# Altium schematic symbol library jlcpcb_2025_04_capacitors_extended_0201.schlib: 1175 symbols (part 1 of 7) (continued)
## 0201CG0R2C500NT
designator C?  Capacitance: 0.2pF  (hidden comment: *)
Capacitor, Ceramic (MLCC), 0.2pF, 50V, C0G, SMD 0201; Manufacturer: FH (Guangdong Fenghua Advanced Tech); Manufacturer Part Number: 0201CG0R2C500NT; Package Size: 0201; JLCPCB Basic Part: No; JLCPCB Part Number: C2857960; Supplier 1: LCSC; Category: Capacitors - MLCC; Supplier Part Number 1: C2857960; Voltage Rating: 50V; Temperature Coefficient: C0G; RoHS: Yes; ComponentLink1Description: Datasheet; ComponentLink2Description: JLCPCB Part URL; ComponentLink2URL: https://jlcpcb.com/partdetail/C2857960; ComponentLink3Description: LCSC Part URL; ComponentLink3URL: https://lcsc.com/product-detail/Multilayer-Ceramic-Capacitors-MLCC---SMD-SMT_FH-Guangdong-Fenghua-Advanced-Tech-FH-Guangdong-Fenghua-Advanced-Tech-0201CG0R2C500NT_C2857960.html
footprint CAP-0201 (0201 (0603M) Capacitor)
pins: 1, 2

## 0201CG0R7C500NT
designator C?  Capacitance: 0.7pF  (hidden comment: *)
Capacitor, Ceramic (MLCC), 0.7pF, 50V, SMD 0201; Manufacturer: FH(Guangdong Fenghua Advanced Tech); Manufacturer Part Number: 0201CG0R7C500NT; Package Size: 0201; JLCPCB Basic Part: No; JLCPCB Part Number: C1322344; Supplier 1: LCSC; Category: Capacitors - MLCC; Supplier Part Number 1: C1322344; Voltage Rating: 50V; RoHS: Yes; ComponentLink1Description: Datasheet; ComponentLink1URL: https://wmsc.lcsc.com/wmsc/upload/file/pdf/v2/lcsc/2304140030_FH--Guangdong-Fenghua-Advanced-Tech-0201CG0R7C500NT_C1322344.pdf; ComponentLink2Description: JLCPCB Part URL; ComponentLink2URL: https://jlcpcb.com/partdetail/C1322344; ComponentLink3Description: LCSC Part URL; ComponentLink3URL: https://lcsc.com/product-detail/Multilayer-Ceramic-Capacitors-MLCC---SMD-SMT_FH-Guangdong-Fenghua-Advanced-Tech-FH-Guangdong-Fenghua-Advanced-Tech-0201CG0R7C500NT_C1322344.html
footprint CAP-0201 (0201 (0603M) Capacitor)
pins: 1, 2

## 0201CG0R8B500NT
designator C?  Capacitance: 0.8pF  (hidden comment: *)
Capacitor, Ceramic (MLCC), 0.8pF, 50V, C0G, SMD 0201; Manufacturer: FH (Guangdong Fenghua Advanced Tech); Manufacturer Part Number: 0201CG0R8B500NT; Package Size: 0201; JLCPCB Basic Part: No; JLCPCB Part Number: C285040; Supplier 1: LCSC; Category: Capacitors - MLCC; Supplier Part Number 1: C285040; Voltage Rating: 50V; Temperature Coefficient: C0G; RoHS: Yes; ComponentLink1Description: Datasheet; ComponentLink2Description: JLCPCB Part URL; ComponentLink2URL: https://jlcpcb.com/partdetail/C285040; ComponentLink3Description: LCSC Part URL; ComponentLink3URL: https://lcsc.com/product-detail/Multilayer-Ceramic-Capacitors-MLCC---SMD-SMT_FH-Guangdong-Fenghua-Advanced-Tech-FH-Guangdong-Fenghua-Advanced-Tech-0201CG0R8B500NT_C285040.html
footprint CAP-0201 (0201 (0603M) Capacitor)
pins: 1, 2

## 0201CG0R8C500NT
designator C?  Capacitance: 0.8pF  (hidden comment: *)
Capacitor, Ceramic (MLCC), 0.8pF, 50V, SMD 0201; Manufacturer: FH(Guangdong Fenghua Advanced Tech); Manufacturer Part Number: 0201CG0R8C500NT; Package Size: 0201; JLCPCB Basic Part: No; JLCPCB Part Number: C1322345; Supplier 1: LCSC; Category: Capacitors - MLCC; Supplier Part Number 1: C1322345; Voltage Rating: 50V; RoHS: Yes; ComponentLink1Description: Datasheet; ComponentLink1URL: https://wmsc.lcsc.com/wmsc/upload/file/pdf/v2/lcsc/2304140030_FH--Guangdong-Fenghua-Advanced-Tech-0201CG0R8C500NT_C1322345.pdf; ComponentLink2Description: JLCPCB Part URL; ComponentLink2URL: https://jlcpcb.com/partdetail/C1322345; ComponentLink3Description: LCSC Part URL; ComponentLink3URL: https://lcsc.com/product-detail/Multilayer-Ceramic-Capacitors-MLCC---SMD-SMT_FH-Guangdong-Fenghua-Advanced-Tech-FH-Guangdong-Fenghua-Advanced-Tech-0201CG0R8C500NT_C1322345.html
footprint CAP-0201 (0201 (0603M) Capacitor)
pins: 1, 2

## 0201CG0R9C500NT
designator C?  Capacitance: 0.9pF  (hidden comment: *)
Capacitor, Ceramic (MLCC), 0.9pF, 50V, C0G, SMD 0201; Manufacturer: FH (Guangdong Fenghua Advanced Tech); Manufacturer Part Number: 0201CG0R9C500NT; Package Size: 0201; JLCPCB Basic Part: No; JLCPCB Part Number: C50387; Supplier 1: LCSC; Category: Capacitors - MLCC; Supplier Part Number 1: C50387; Voltage Rating: 50V; Temperature Coefficient: C0G; RoHS: Yes; ComponentLink1Description: Datasheet; ComponentLink1URL: https://wmsc.lcsc.com/wmsc/upload/file/pdf/v2/lcsc/2304140030_FH--Guangdong-Fenghua-Advanced-Tech-0201CG0R9C500NT_C50387.pdf; ComponentLink2Description: JLCPCB Part URL; ComponentLink2URL: https://jlcpcb.com/partdetail/C50387; ComponentLink3Description: LCSC Part URL; ComponentLink3URL: https://lcsc.com/product-detail/Multilayer-Ceramic-Capacitors-MLCC---SMD-SMT_FH-Guangdong-Fenghua-Advanced-Tech-FH-Guangdong-Fenghua-Advanced-Tech-0201CG0R9C500NT_C50387.html
footprint CAP-0201 (0201 (0603M) Capacitor)
pins: 1, 2

## 0201CG1R0C250NT
designator C?  Capacitance: 1pF  (hidden comment: *)
Capacitor, Ceramic (MLCC), 1pF, 25V, C0G, SMD 0201; Manufacturer: FH(Guangdong Fenghua Advanced Tech); Manufacturer Part Number: 0201CG1R0C250NT; Package Size: 0201; JLCPCB Basic Part: No; JLCPCB Part Number: C301901; Supplier 1: LCSC; Category: Capacitors - MLCC; Supplier Part Number 1: C301901; Voltage Rating: 25V; Temperature Coefficient: C0G; RoHS: Yes; ComponentLink1Description: Datasheet; ComponentLink1URL: https://wmsc.lcsc.com/wmsc/upload/file/pdf/v2/lcsc/2304140030_FH--Guangdong-Fenghua-Advanced-Tech-0201CG1R0C250NT_C301901.pdf; ComponentLink2Description: JLCPCB Part URL; ComponentLink2URL: https://jlcpcb.com/partdetail/C301901; ComponentLink3Description: LCSC Part URL; ComponentLink3URL: https://lcsc.com/product-detail/Multilayer-Ceramic-Capacitors-MLCC---SMD-SMT_FH-Guangdong-Fenghua-Advanced-Tech-FH-Guangdong-Fenghua-Advanced-Tech-0201CG1R0C250NT_C301901.html
footprint CAP-0201 (0201 (0603M) Capacitor)
pins: 1, 2

## 0201CG1R1B250NT
designator C?  Capacitance: 1.1pF  (hidden comment: *)
Capacitor, Ceramic (MLCC), 1.1pF, 25V, C0G, SMD 0201; Manufacturer: FH (Guangdong Fenghua Advanced Tech); Manufacturer Part Number: 0201CG1R1B250NT; Package Size: 0201; JLCPCB Basic Part: No; JLCPCB Part Number: C2857962; Supplier 1: LCSC; Category: Capacitors - MLCC; Supplier Part Number 1: C2857962; Voltage Rating: 25V; Temperature Coefficient: C0G; RoHS: Yes; ComponentLink1Description: Datasheet; ComponentLink2Description: JLCPCB Part URL; ComponentLink2URL: https://jlcpcb.com/partdetail/C2857962; ComponentLink3Description: LCSC Part URL; ComponentLink3URL: https://lcsc.com/product-detail/Multilayer-Ceramic-Capacitors-MLCC---SMD-SMT_FH-Guangdong-Fenghua-Advanced-Tech-FH-Guangdong-Fenghua-Advanced-Tech-0201CG1R1B250NT_C2857962.html
footprint CAP-0201 (0201 (0603M) Capacitor)
pins: 1, 2

## 0201CG1R2B500NT
designator C?  Capacitance: 1.2pF  (hidden comment: *)
Capacitor, Ceramic (MLCC), 1.2pF, 50V, C0G, SMD 0201; Manufacturer: FH(Guangdong Fenghua Advanced Tech); Manufacturer Part Number: 0201CG1R2B500NT; Package Size: 0201; JLCPCB Basic Part: No; JLCPCB Part Number: C285029; Supplier 1: LCSC; Category: Capacitors - MLCC; Supplier Part Number 1: C285029; Voltage Rating: 50V; Temperature Coefficient: C0G; RoHS: Yes; ComponentLink1Description: Datasheet; ComponentLink1URL: https://wmsc.lcsc.com/wmsc/upload/file/pdf/v2/lcsc/2304140030_FH--Guangdong-Fenghua-Advanced-Tech-0201CG1R2B500NT_C285029.pdf; ComponentLink2Description: JLCPCB Part URL; ComponentLink2URL: https://jlcpcb.com/partdetail/C285029; ComponentLink3Description: LCSC Part URL; ComponentLink3URL: https://lcsc.com/product-detail/Multilayer-Ceramic-Capacitors-MLCC---SMD-SMT_FH-Guangdong-Fenghua-Advanced-Tech-FH-Guangdong-Fenghua-Advanced-Tech-0201CG1R2B500NT_C285029.html
footprint CAP-0201 (0201 (0603M) Capacitor)
pins: 1, 2

## 0201CG1R3B250NT
designator C?  Capacitance: 1.3pF  (hidden comment: *)
Capacitor, Ceramic (MLCC), 1.3pF, 25V, C0G, SMD 0201; Manufacturer: FH (Guangdong Fenghua Advanced Tech); Manufacturer Part Number: 0201CG1R3B250NT; Package Size: 0201; JLCPCB Basic Part: No; JLCPCB Part Number: C2857963; Supplier 1: LCSC; Category: Capacitors - MLCC; Supplier Part Number 1: C2857963; Voltage Rating: 25V; Temperature Coefficient: C0G; RoHS: Yes; ComponentLink1Description: Datasheet; ComponentLink2Description: JLCPCB Part URL; ComponentLink2URL: https://jlcpcb.com/partdetail/C2857963; ComponentLink3Description: LCSC Part URL; ComponentLink3URL: https://lcsc.com/product-detail/Multilayer-Ceramic-Capacitors-MLCC---SMD-SMT_FH-Guangdong-Fenghua-Advanced-Tech-FH-Guangdong-Fenghua-Advanced-Tech-0201CG1R3B250NT_C2857963.html
footprint CAP-0201 (0201 (0603M) Capacitor)
pins: 1, 2

## 0201CG1R3C500NT
designator C?  Capacitance: 1.3pF  (hidden comment: *)
Capacitor, Ceramic (MLCC), 1.3pF, 50V, C0G, SMD 0201; Manufacturer: FH(Guangdong Fenghua Advanced Tech); Manufacturer Part Number: 0201CG1R3C500NT; Package Size: 0201; JLCPCB Basic Part: No; JLCPCB Part Number: C913423; Supplier 1: LCSC; Category: Capacitors - MLCC; Supplier Part Number 1: C913423; Voltage Rating: 50V; Temperature Coefficient: C0G; RoHS: Yes; ComponentLink1Description: Datasheet; ComponentLink1URL: https://wmsc.lcsc.com/wmsc/upload/file/pdf/v2/lcsc/2304140030_FH--Guangdong-Fenghua-Advanced-Tech-0201CG1R3C500NT_C913423.pdf; ComponentLink2Description: JLCPCB Part URL; ComponentLink2URL: https://jlcpcb.com/partdetail/C913423; ComponentLink3Description: LCSC Part URL; ComponentLink3URL: https://lcsc.com/product-detail/Multilayer-Ceramic-Capacitors-MLCC---SMD-SMT_FH-Guangdong-Fenghua-Advanced-Tech-FH-Guangdong-Fenghua-Advanced-Tech-0201CG1R3C500NT_C913423.html
footprint CAP-0201 (0201 (0603M) Capacitor)
pins: 1, 2

## 0201CG1R5B500NT
designator C?  Capacitance: 1.5pF  (hidden comment: *)
Capacitor, Ceramic (MLCC), 1.5pF, 50V, C0G, SMD 0201; Manufacturer: FH (Guangdong Fenghua Advanced Tech); Manufacturer Part Number: 0201CG1R5B500NT; Package Size: 0201; JLCPCB Basic Part: No; JLCPCB Part Number: C284990; Supplier 1: LCSC; Category: Capacitors - MLCC; Supplier Part Number 1: C284990; Voltage Rating: 50V; Temperature Coefficient: C0G; RoHS: Yes; ComponentLink1Description: Datasheet; ComponentLink1URL: https://wmsc.lcsc.com/wmsc/upload/file/pdf/v2/lcsc/2304140030_FH--Guangdong-Fenghua-Advanced-Tech-0201CG1R5B500NT_C284990.pdf; ComponentLink2Description: JLCPCB Part URL; ComponentLink2URL: https://jlcpcb.com/partdetail/C284990; ComponentLink3Description: LCSC Part URL; ComponentLink3URL: https://lcsc.com/product-detail/Multilayer-Ceramic-Capacitors-MLCC---SMD-SMT_FH-Guangdong-Fenghua-Advanced-Tech-FH-Guangdong-Fenghua-Advanced-Tech-0201CG1R5B500NT_C284990.html
footprint CAP-0201 (0201 (0603M) Capacitor)
pins: 1, 2

## 0201CG1R5C250NT
designator C?  Capacitance: 1.5pF  (hidden comment: *)
Capacitor, Ceramic (MLCC), 1.5pF, 25V, C0G, SMD 0201; Manufacturer: FH (Guangdong Fenghua Advanced Tech); Manufacturer Part Number: 0201CG1R5C250NT; Package Size: 0201; JLCPCB Basic Part: No; JLCPCB Part Number: C301903; Supplier 1: LCSC; Category: Capacitors - MLCC; Supplier Part Number 1: C301903; Voltage Rating: 25V; Temperature Coefficient: C0G; RoHS: Yes; ComponentLink1Description: Datasheet; ComponentLink1URL: https://wmsc.lcsc.com/wmsc/upload/file/pdf/v2/lcsc/2304140030_FH--Guangdong-Fenghua-Advanced-Tech-0201CG1R5C250NT_C301903.pdf; ComponentLink2Description: JLCPCB Part URL; ComponentLink2URL: https://jlcpcb.com/partdetail/C301903; ComponentLink3Description: LCSC Part URL; ComponentLink3URL: https://lcsc.com/product-detail/Multilayer-Ceramic-Capacitors-MLCC---SMD-SMT_FH-Guangdong-Fenghua-Advanced-Tech-FH-Guangdong-Fenghua-Advanced-Tech-0201CG1R5C250NT_C301903.html
footprint CAP-0201 (0201 (0603M) Capacitor)
pins: 1, 2

## 0201CG1R5C500NT
designator C?  Capacitance: 1.5pF  (hidden comment: *)
Capacitor, Ceramic (MLCC), 1.5pF, 50V, C0G, SMD 0201; Manufacturer: FH (Guangdong Fenghua Advanced Tech); Manufacturer Part Number: 0201CG1R5C500NT; Package Size: 0201; JLCPCB Basic Part: No; JLCPCB Part Number: C50389; Supplier 1: LCSC; Category: Capacitors - MLCC; Supplier Part Number 1: C50389; Voltage Rating: 50V; Temperature Coefficient: C0G; RoHS: Yes; ComponentLink1Description: Datasheet; ComponentLink1URL: https://wmsc.lcsc.com/wmsc/upload/file/pdf/v2/lcsc/2304140030_FH--Guangdong-Fenghua-Advanced-Tech-0201CG1R5C500NT_C50389.pdf; ComponentLink2Description: JLCPCB Part URL; ComponentLink2URL: https://jlcpcb.com/partdetail/C50389; ComponentLink3Description: LCSC Part URL; ComponentLink3URL: https://lcsc.com/product-detail/Multilayer-Ceramic-Capacitors-MLCC---SMD-SMT_FH-Guangdong-Fenghua-Advanced-Tech-FH-Guangdong-Fenghua-Advanced-Tech-0201CG1R5C500NT_C50389.html
footprint CAP-0201 (0201 (0603M) Capacitor)
pins: 1, 2

## 0201CG1R8C250NT
designator C?  Capacitance: 1.8pF  (hidden comment: *)
Capacitor, Ceramic (MLCC), 1.8pF, 25V, C0G, SMD 0201; Manufacturer: FH (Guangdong Fenghua Advanced Tech); Manufacturer Part Number: 0201CG1R8C250NT; Package Size: 0201; JLCPCB Basic Part: No; JLCPCB Part Number: C285155; Supplier 1: LCSC; Category: Capacitors - MLCC; Supplier Part Number 1: C285155; Voltage Rating: 25V; Temperature Coefficient: C0G; RoHS: Yes; ComponentLink1Description: Datasheet; ComponentLink2Description: JLCPCB Part URL; ComponentLink2URL: https://jlcpcb.com/partdetail/C285155; ComponentLink3Description: LCSC Part URL; ComponentLink3URL: https://lcsc.com/product-detail/Multilayer-Ceramic-Capacitors-MLCC---SMD-SMT_FH-Guangdong-Fenghua-Advanced-Tech-FH-Guangdong-Fenghua-Advanced-Tech-0201CG1R8C250NT_C285155.html
footprint CAP-0201 (0201 (0603M) Capacitor)
pins: 1, 2

## 0201CG2R2B250NT
designator C?  Capacitance: 2.2pF  (hidden comment: *)
Capacitor, Ceramic (MLCC), 2.2pF, 25V, C0G, SMD 0201; Manufacturer: FH (Guangdong Fenghua Advanced Tech); Manufacturer Part Number: 0201CG2R2B250NT; Package Size: 0201; JLCPCB Basic Part: No; JLCPCB Part Number: C285141; Supplier 1: LCSC; Category: Capacitors - MLCC; Supplier Part Number 1: C285141; Voltage Rating: 25V; Temperature Coefficient: C0G; RoHS: Yes; ComponentLink1Description: Datasheet; ComponentLink2Description: JLCPCB Part URL; ComponentLink2URL: https://jlcpcb.com/partdetail/C285141; ComponentLink3Description: LCSC Part URL; ComponentLink3URL: https://lcsc.com/product-detail/Multilayer-Ceramic-Capacitors-MLCC---SMD-SMT_FH-Guangdong-Fenghua-Advanced-Tech-FH-Guangdong-Fenghua-Advanced-Tech-0201CG2R2B250NT_C285141.html
footprint CAP-0201 (0201 (0603M) Capacitor)
pins: 1, 2

## 0201CG2R4B500NT
designator C?  Capacitance: 2.4pF  (hidden comment: *)
Capacitor, Ceramic (MLCC), 2.4pF, 50V, C0G, SMD 0201; Manufacturer: FH (Guangdong Fenghua Advanced Tech); Manufacturer Part Number: 0201CG2R4B500NT; Package Size: 0201; JLCPCB Basic Part: No; JLCPCB Part Number: C2857964; Supplier 1: LCSC; Category: Capacitors - MLCC; Supplier Part Number 1: C2857964; Voltage Rating: 50V; Temperature Coefficient: C0G; RoHS: Yes; ComponentLink1Description: Datasheet; ComponentLink2Description: JLCPCB Part URL; ComponentLink2URL: https://jlcpcb.com/partdetail/C2857964; ComponentLink3Description: LCSC Part URL; ComponentLink3URL: https://lcsc.com/product-detail/Multilayer-Ceramic-Capacitors-MLCC---SMD-SMT_FH-Guangdong-Fenghua-Advanced-Tech-FH-Guangdong-Fenghua-Advanced-Tech-0201CG2R4B500NT_C2857964.html
footprint CAP-0201 (0201 (0603M) Capacitor)
pins: 1, 2

## 0201CG2R7B500NT
designator C?  Capacitance: 2.7pF  (hidden comment: *)
Capacitor, Ceramic (MLCC), 2.7pF, 50V, C0G, SMD 0201; Manufacturer: FH (Guangdong Fenghua Advanced Tech); Manufacturer Part Number: 0201CG2R7B500NT; Package Size: 0201; JLCPCB Basic Part: No; JLCPCB Part Number: C285196; Supplier 1: LCSC; Category: Capacitors - MLCC; Supplier Part Number 1: C285196; Voltage Rating: 50V; Temperature Coefficient: C0G; RoHS: Yes; ComponentLink1Description: Datasheet; ComponentLink2Description: JLCPCB Part URL; ComponentLink2URL: https://jlcpcb.com/partdetail/C285196; ComponentLink3Description: LCSC Part URL; ComponentLink3URL: https://lcsc.com/product-detail/Multilayer-Ceramic-Capacitors-MLCC---SMD-SMT_FH-Guangdong-Fenghua-Advanced-Tech-FH-Guangdong-Fenghua-Advanced-Tech-0201CG2R7B500NT_C285196.html
footprint CAP-0201 (0201 (0603M) Capacitor)
pins: 1, 2

## 0201CG2R7C500NT
designator C?  Capacitance: 2.7pF  (hidden comment: *)
Capacitor, Ceramic (MLCC), 2.7pF, 50V, C0G, SMD 0201; Manufacturer: FH(Guangdong Fenghua Advanced Tech); Manufacturer Part Number: 0201CG2R7C500NT; Package Size: 0201; JLCPCB Basic Part: No; JLCPCB Part Number: C509406; Supplier 1: LCSC; Category: Capacitors - MLCC; Supplier Part Number 1: C509406; Voltage Rating: 50V; Temperature Coefficient: C0G; RoHS: Yes; ComponentLink1Description: Datasheet; ComponentLink1URL: https://wmsc.lcsc.com/wmsc/upload/file/pdf/v2/lcsc/2304140030_FH--Guangdong-Fenghua-Advanced-Tech-0201CG2R7C500NT_C509406.pdf; ComponentLink2Description: JLCPCB Part URL; ComponentLink2URL: https://jlcpcb.com/partdetail/C509406; ComponentLink3Description: LCSC Part URL; ComponentLink3URL: https://lcsc.com/product-detail/Multilayer-Ceramic-Capacitors-MLCC---SMD-SMT_FH-Guangdong-Fenghua-Advanced-Tech-FH-Guangdong-Fenghua-Advanced-Tech-0201CG2R7C500NT_C509406.html
footprint CAP-0201 (0201 (0603M) Capacitor)
pins: 1, 2

## 0201CG3R0C250NT
designator C?  Capacitance: 3pF  (hidden comment: *)
Capacitor, Ceramic (MLCC), 3pF, 25V, C0G, SMD 0201; Manufacturer: FH (Guangdong Fenghua Advanced Tech); Manufacturer Part Number: 0201CG3R0C250NT; Package Size: 0201; JLCPCB Basic Part: No; JLCPCB Part Number: C301908; Supplier 1: LCSC; Category: Capacitors - MLCC; Supplier Part Number 1: C301908; Voltage Rating: 25V; Temperature Coefficient: C0G; RoHS: Yes; ComponentLink1Description: Datasheet; ComponentLink1URL: https://wmsc.lcsc.com/wmsc/upload/file/pdf/v2/lcsc/2304140030_FH--Guangdong-Fenghua-Advanced-Tech-0201CG3R0C250NT_C301908.pdf; ComponentLink2Description: JLCPCB Part URL; ComponentLink2URL: https://jlcpcb.com/partdetail/C301908; ComponentLink3Description: LCSC Part URL; ComponentLink3URL: https://lcsc.com/product-detail/Multilayer-Ceramic-Capacitors-MLCC---SMD-SMT_FH-Guangdong-Fenghua-Advanced-Tech-FH-Guangdong-Fenghua-Advanced-Tech-0201CG3R0C250NT_C301908.html
footprint CAP-0201 (0201 (0603M) Capacitor)
pins: 1, 2

## 0201CG3R3B500NT
designator C?  Capacitance: 3.3pF  (hidden comment: *)
Capacitor, Ceramic (MLCC), 3.3pF, 50V, C0G, SMD 0201; Manufacturer: FH (Guangdong Fenghua Advanced Tech); Manufacturer Part Number: 0201CG3R3B500NT; Package Size: 0201; JLCPCB Basic Part: No; JLCPCB Part Number: C285027; Supplier 1: LCSC; Category: Capacitors - MLCC; Supplier Part Number 1: C285027; Voltage Rating: 50V; Temperature Coefficient: C0G; RoHS: Yes; ComponentLink1Description: Datasheet; ComponentLink1URL: https://wmsc.lcsc.com/wmsc/upload/file/pdf/v2/lcsc/2304140030_FH--Guangdong-Fenghua-Advanced-Tech-0201CG3R3B500NT_C285027.pdf; ComponentLink2Description: JLCPCB Part URL; ComponentLink2URL: https://jlcpcb.com/partdetail/C285027; ComponentLink3Description: LCSC Part URL; ComponentLink3URL: https://lcsc.com/product-detail/Multilayer-Ceramic-Capacitors-MLCC---SMD-SMT_FH-Guangdong-Fenghua-Advanced-Tech-FH-Guangdong-Fenghua-Advanced-Tech-0201CG3R3B500NT_C285027.html
footprint CAP-0201 (0201 (0603M) Capacitor)
pins: 1, 2

## 0201CG3R6C500NT
designator C?  Capacitance: 3.6pF  (hidden comment: *)
Capacitor, Ceramic (MLCC), 3.6pF, 50V, C0G, SMD 0201; Manufacturer: FH (Guangdong Fenghua Advanced Tech); Manufacturer Part Number: 0201CG3R6C500NT; Package Size: 0201; JLCPCB Basic Part: No; JLCPCB Part Number: C301911; Supplier 1: LCSC; Category: Capacitors - MLCC; Supplier Part Number 1: C301911; Voltage Rating: 50V; Temperature Coefficient: C0G; RoHS: Yes; ComponentLink1Description: Datasheet; ComponentLink1URL: https://wmsc.lcsc.com/wmsc/upload/file/pdf/v2/lcsc/2304140030_FH--Guangdong-Fenghua-Advanced-Tech-0201CG3R6C500NT_C301911.pdf; ComponentLink2Description: JLCPCB Part URL; ComponentLink2URL: https://jlcpcb.com/partdetail/C301911; ComponentLink3Description: LCSC Part URL; ComponentLink3URL: https://lcsc.com/product-detail/Multilayer-Ceramic-Capacitors-MLCC---SMD-SMT_FH-Guangdong-Fenghua-Advanced-Tech-FH-Guangdong-Fenghua-Advanced-Tech-0201CG3R6C500NT_C301911.html
footprint CAP-0201 (0201 (0603M) Capacitor)
pins: 1, 2

## 0201CG3R9C250NT
designator C?  Capacitance: 3.9pF  (hidden comment: *)
Capacitor, Ceramic (MLCC), 3.9pF, 25V, C0G, SMD 0201; Manufacturer: FH (Guangdong Fenghua Advanced Tech); Manufacturer Part Number: 0201CG3R9C250NT; Package Size: 0201; JLCPCB Basic Part: No; JLCPCB Part Number: C285100; Supplier 1: LCSC; Category: Capacitors - MLCC; Supplier Part Number 1: C285100; Voltage Rating: 25V; Temperature Coefficient: C0G; RoHS: Yes; ComponentLink1Description: Datasheet; ComponentLink2Description: JLCPCB Part URL; ComponentLink2URL: https://jlcpcb.com/partdetail/C285100; ComponentLink3Description: LCSC Part URL; ComponentLink3URL: https://lcsc.com/product-detail/Multilayer-Ceramic-Capacitors-MLCC---SMD-SMT_FH-Guangdong-Fenghua-Advanced-Tech-FH-Guangdong-Fenghua-Advanced-Tech-0201CG3R9C250NT_C285100.html
footprint CAP-0201 (0201 (0603M) Capacitor)
pins: 1, 2

## 0201CG4R3C500NT
designator C?  Capacitance: 4.3pF  (hidden comment: *)
Capacitor, Ceramic (MLCC), 4.3pF, 50V, C0G, SMD 0201; Manufacturer: FH (Guangdong Fenghua Advanced Tech); Manufacturer Part Number: 0201CG4R3C500NT; Package Size: 0201; JLCPCB Basic Part: No; JLCPCB Part Number: C285053; Supplier 1: LCSC; Category: Capacitors - MLCC; Supplier Part Number 1: C285053; Voltage Rating: 50V; Temperature Coefficient: C0G; RoHS: Yes; ComponentLink1Description: Datasheet; ComponentLink1URL: https://wmsc.lcsc.com/wmsc/upload/file/pdf/v2/lcsc/2304140030_FH--Guangdong-Fenghua-Advanced-Tech-0201CG4R3C500NT_C285053.pdf; ComponentLink2Description: JLCPCB Part URL; ComponentLink2URL: https://jlcpcb.com/partdetail/C285053; ComponentLink3Description: LCSC Part URL; ComponentLink3URL: https://lcsc.com/product-detail/Multilayer-Ceramic-Capacitors-MLCC---SMD-SMT_FH-Guangdong-Fenghua-Advanced-Tech-FH-Guangdong-Fenghua-Advanced-Tech-0201CG4R3C500NT_C285053.html
footprint CAP-0201 (0201 (0603M) Capacitor)
pins: 1, 2

## 0201CG4R7B500NT
designator C?  Capacitance: 4.7pF  (hidden comment: *)
Capacitor, Ceramic (MLCC), 4.7pF, 50V, C0G, SMD 0201; Manufacturer: FH(Guangdong Fenghua Advanced Tech); Manufacturer Part Number: 0201CG4R7B500NT; Package Size: 0201; JLCPCB Basic Part: No; JLCPCB Part Number: C284976; Supplier 1: LCSC; Category: Capacitors - MLCC; Supplier Part Number 1: C284976; Voltage Rating: 50V; Temperature Coefficient: C0G; RoHS: Yes; ComponentLink1Description: Datasheet; ComponentLink1URL: https://wmsc.lcsc.com/wmsc/upload/file/pdf/v2/lcsc/2304140030_FH--Guangdong-Fenghua-Advanced-Tech-0201CG4R7B500NT_C284976.pdf; ComponentLink2Description: JLCPCB Part URL; ComponentLink2URL: https://jlcpcb.com/partdetail/C284976; ComponentLink3Description: LCSC Part URL; ComponentLink3URL: https://lcsc.com/product-detail/Multilayer-Ceramic-Capacitors-MLCC---SMD-SMT_FH-Guangdong-Fenghua-Advanced-Tech-FH-Guangdong-Fenghua-Advanced-Tech-0201CG4R7B500NT_C284976.html
footprint CAP-0201 (0201 (0603M) Capacitor)
pins: 1, 2

## 0201CG4R7C250NT
designator C?  Capacitance: 4.7pF  (hidden comment: *)
Capacitor, Ceramic (MLCC), 4.7pF, 25V, C0G, SMD 0201; Manufacturer: FH (Guangdong Fenghua Advanced Tech); Manufacturer Part Number: 0201CG4R7C250NT; Package Size: 0201; JLCPCB Basic Part: No; JLCPCB Part Number: C285055; Supplier 1: LCSC; Category: Capacitors - MLCC; Supplier Part Number 1: C285055; Voltage Rating: 25V; Temperature Coefficient: C0G; RoHS: Yes; ComponentLink1Description: Datasheet; ComponentLink1URL: https://wmsc.lcsc.com/wmsc/upload/file/pdf/v2/lcsc/2304140030_FH--Guangdong-Fenghua-Advanced-Tech-0201CG4R7C250NT_C285055.pdf; ComponentLink2Description: JLCPCB Part URL; ComponentLink2URL: https://jlcpcb.com/partdetail/C285055; ComponentLink3Description: LCSC Part URL; ComponentLink3URL: https://lcsc.com/product-detail/Multilayer-Ceramic-Capacitors-MLCC---SMD-SMT_FH-Guangdong-Fenghua-Advanced-Tech-FH-Guangdong-Fenghua-Advanced-Tech-0201CG4R7C250NT_C285055.html
footprint CAP-0201 (0201 (0603M) Capacitor)
pins: 1, 2

## 0201CG4R7C500NT
designator C?  Capacitance: 4.7pF  (hidden comment: *)
Capacitor, Ceramic (MLCC), 4.7pF, ±5%, 50V, C0G, ±5%, SMD 0201; Manufacturer: FH(Guangdong Fenghua Advanced Tech); Manufacturer Part Number: 0201CG4R7C500NT; Package Size: 0201; JLCPCB Basic Part: No; JLCPCB Part Number: C255351; Supplier 1: LCSC; Category: Capacitors - MLCC; Supplier Part Number 1: C255351; Tolerance: ±5%; Voltage Rating: 50V; Temperature Coefficient: C0G; RoHS: Yes; ComponentLink1Description: Datasheet; ComponentLink1URL: https://wmsc.lcsc.com/wmsc/upload/file/pdf/v2/lcsc/2304140030_FH--Guangdong-Fenghua-Advanced-Tech-0201CG4R7C500NT_C255351.pdf; ComponentLink2Description: JLCPCB Part URL; ComponentLink2URL: https://jlcpcb.com/partdetail/C255351; ComponentLink3Description: LCSC Part URL; ComponentLink3URL: https://lcsc.com/product-detail/Multilayer-Ceramic-Capacitors-MLCC---SMD-SMT_FH-Guangdong-Fenghua-Advanced-Tech-FH-Guangdong-Fenghua-Advanced-Tech-0201CG4R7C500NT_C255351.html
footprint CAP-0201 (0201 (0603M) Capacitor)
pins: 1, 2

## 0201CG5R0C250NT
designator C?  Capacitance: 5pF  (hidden comment: *)
Capacitor, Ceramic (MLCC), 5pF, 25V, C0G, SMD 0201; Manufacturer: FH (Guangdong Fenghua Advanced Tech); Manufacturer Part Number: 0201CG5R0C250NT; Package Size: 0201; JLCPCB Basic Part: No; JLCPCB Part Number: C880313; Supplier 1: LCSC; Category: Capacitors - MLCC; Supplier Part Number 1: C880313; Voltage Rating: 25V; Temperature Coefficient: C0G; RoHS: Yes; ComponentLink1Description: Datasheet; ComponentLink1URL: https://wmsc.lcsc.com/wmsc/upload/file/pdf/v2/lcsc/2304140030_FH--Guangdong-Fenghua-Advanced-Tech-0201CG5R0C250NT_C880313.pdf; ComponentLink2Description: JLCPCB Part URL; ComponentLink2URL: https://jlcpcb.com/partdetail/C880313; ComponentLink3Description: LCSC Part URL; ComponentLink3URL: https://lcsc.com/product-detail/Multilayer-Ceramic-Capacitors-MLCC---SMD-SMT_FH-Guangdong-Fenghua-Advanced-Tech-FH-Guangdong-Fenghua-Advanced-Tech-0201CG5R0C250NT_C880313.html
footprint CAP-0201 (0201 (0603M) Capacitor)
pins: 1, 2

## 0201CG5R6C500NT
designator C?  Capacitance: 5.6pF  (hidden comment: *)
Capacitor, Ceramic (MLCC), 5.6pF, 50V, C0G, SMD 0201; Manufacturer: FH (Guangdong Fenghua Advanced Tech); Manufacturer Part Number: 0201CG5R6C500NT; Package Size: 0201; JLCPCB Basic Part: No; JLCPCB Part Number: C57781; Supplier 1: LCSC; Category: Capacitors - MLCC; Supplier Part Number 1: C57781; Voltage Rating: 50V; Temperature Coefficient: C0G; RoHS: Yes; ComponentLink1Description: Datasheet; ComponentLink1URL: https://wmsc.lcsc.com/wmsc/upload/file/pdf/v2/lcsc/2304140030_FH--Guangdong-Fenghua-Advanced-Tech-0201CG5R6C500NT_C57781.pdf; ComponentLink2Description: JLCPCB Part URL; ComponentLink2URL: https://jlcpcb.com/partdetail/C57781; ComponentLink3Description: LCSC Part URL; ComponentLink3URL: https://lcsc.com/product-detail/Multilayer-Ceramic-Capacitors-MLCC---SMD-SMT_FH-Guangdong-Fenghua-Advanced-Tech-FH-Guangdong-Fenghua-Advanced-Tech-0201CG5R6C500NT_C57781.html
footprint CAP-0201 (0201 (0603M) Capacitor)
pins: 1, 2

## 0201CG5R6D500NT
designator C?  Capacitance: 5.6pF  (hidden comment: *)
Capacitor, Ceramic (MLCC), 5.6pF, 50V, C0G, SMD 0201; Manufacturer: FH (Guangdong Fenghua Advanced Tech); Manufacturer Part Number: 0201CG5R6D500NT; Package Size: 0201; JLCPCB Basic Part: No; JLCPCB Part Number: C285131; Supplier 1: LCSC; Category: Capacitors - MLCC; Supplier Part Number 1: C285131; Voltage Rating: 50V; Temperature Coefficient: C0G; RoHS: Yes; ComponentLink1Description: Datasheet; ComponentLink1URL: https://wmsc.lcsc.com/wmsc/upload/file/pdf/v2/lcsc/2304140030_FH--Guangdong-Fenghua-Advanced-Tech-0201CG5R6D500NT_C285131.pdf; ComponentLink2Description: JLCPCB Part URL; ComponentLink2URL: https://jlcpcb.com/partdetail/C285131; ComponentLink3Description: LCSC Part URL; ComponentLink3URL: https://lcsc.com/product-detail/Multilayer-Ceramic-Capacitors-MLCC---SMD-SMT_FH-Guangdong-Fenghua-Advanced-Tech-FH-Guangdong-Fenghua-Advanced-Tech-0201CG5R6D500NT_C285131.html
footprint CAP-0201 (0201 (0603M) Capacitor)
pins: 1, 2

## 0201CG6R0C500NT
designator C?  Capacitance: 6pF  (hidden comment: *)
Capacitor, Ceramic (MLCC), 6pF, 50V, C0G, SMD 0201; Manufacturer: FH (Guangdong Fenghua Advanced Tech); Manufacturer Part Number: 0201CG6R0C500NT; Package Size: 0201; JLCPCB Basic Part: No; JLCPCB Part Number: C285048; Supplier 1: LCSC; Category: Capacitors - MLCC; Supplier Part Number 1: C285048; Voltage Rating: 50V; Temperature Coefficient: C0G; RoHS: Yes; ComponentLink1Description: Datasheet; ComponentLink1URL: https://wmsc.lcsc.com/wmsc/upload/file/pdf/v2/lcsc/2304140030_FH--Guangdong-Fenghua-Advanced-Tech-0201CG6R0C500NT_C285048.pdf; ComponentLink2Description: JLCPCB Part URL; ComponentLink2URL: https://jlcpcb.com/partdetail/C285048; ComponentLink3Description: LCSC Part URL; ComponentLink3URL: https://lcsc.com/product-detail/Multilayer-Ceramic-Capacitors-MLCC---SMD-SMT_FH-Guangdong-Fenghua-Advanced-Tech-FH-Guangdong-Fenghua-Advanced-Tech-0201CG6R0C500NT_C285048.html
footprint CAP-0201 (0201 (0603M) Capacitor)
pins: 1, 2

## 0201CG6R2D250NT
designator C?  Capacitance: 6.2pF  (hidden comment: *)
Capacitor, Ceramic (MLCC), 6.2pF, 25V, C0G, SMD 0201; Manufacturer: FH (Guangdong Fenghua Advanced Tech); Manufacturer Part Number: 0201CG6R2D250NT; Package Size: 0201; JLCPCB Basic Part: No; JLCPCB Part Number: C913426; Supplier 1: LCSC; Category: Capacitors - MLCC; Supplier Part Number 1: C913426; Voltage Rating: 25V; Temperature Coefficient: C0G; RoHS: Yes; ComponentLink1Description: Datasheet; ComponentLink1URL: https://wmsc.lcsc.com/wmsc/upload/file/pdf/v2/lcsc/2304140030_FH--Guangdong-Fenghua-Advanced-Tech-0201CG6R2D250NT_C913426.pdf; ComponentLink2Description: JLCPCB Part URL; ComponentLink2URL: https://jlcpcb.com/partdetail/C913426; ComponentLink3Description: LCSC Part URL; ComponentLink3URL: https://lcsc.com/product-detail/Multilayer-Ceramic-Capacitors-MLCC---SMD-SMT_FH-Guangdong-Fenghua-Advanced-Tech-FH-Guangdong-Fenghua-Advanced-Tech-0201CG6R2D250NT_C913426.html
footprint CAP-0201 (0201 (0603M) Capacitor)
pins: 1, 2

## 0201CG6R8B500NT
designator C?  Capacitance: 6.8pF  (hidden comment: *)
Capacitor, Ceramic (MLCC), 6.8pF, 50V, C0G, SMD 0201; Manufacturer: FH (Guangdong Fenghua Advanced Tech); Manufacturer Part Number: 0201CG6R8B500NT; Package Size: 0201; JLCPCB Basic Part: No; JLCPCB Part Number: C880310; Supplier 1: LCSC; Category: Capacitors - MLCC; Supplier Part Number 1: C880310; Voltage Rating: 50V; Temperature Coefficient: C0G; RoHS: Yes; ComponentLink1Description: Datasheet; ComponentLink1URL: https://wmsc.lcsc.com/wmsc/upload/file/pdf/v2/lcsc/2304140030_FH--Guangdong-Fenghua-Advanced-Tech-0201CG6R8B500NT_C880310.pdf; ComponentLink2Description: JLCPCB Part URL; ComponentLink2URL: https://jlcpcb.com/partdetail/C880310; ComponentLink3Description: LCSC Part URL; ComponentLink3URL: https://lcsc.com/product-detail/Multilayer-Ceramic-Capacitors-MLCC---SMD-SMT_FH-Guangdong-Fenghua-Advanced-Tech-FH-Guangdong-Fenghua-Advanced-Tech-0201CG6R8B500NT_C880310.html
footprint CAP-0201 (0201 (0603M) Capacitor)
pins: 1, 2

## 0201CG8R0D250NT
designator C?  Capacitance: 8pF  (hidden comment: *)
Capacitor, Ceramic (MLCC), 8pF, 25V, C0G, SMD 0201; Manufacturer: FH(Guangdong Fenghua Advanced Tech); Manufacturer Part Number: 0201CG8R0D250NT; Package Size: 0201; JLCPCB Basic Part: No; JLCPCB Part Number: C285063; Supplier 1: LCSC; Category: Capacitors - MLCC; Supplier Part Number 1: C285063; Voltage Rating: 25V; Temperature Coefficient: C0G; RoHS: Yes; ComponentLink1Description: Datasheet; ComponentLink1URL: https://wmsc.lcsc.com/wmsc/upload/file/pdf/v2/lcsc/2304140030_FH--Guangdong-Fenghua-Advanced-Tech-0201CG8R0D250NT_C285063.pdf; ComponentLink2Description: JLCPCB Part URL; ComponentLink2URL: https://jlcpcb.com/partdetail/C285063; ComponentLink3Description: LCSC Part URL; ComponentLink3URL: https://lcsc.com/product-detail/Multilayer-Ceramic-Capacitors-MLCC---SMD-SMT_FH-Guangdong-Fenghua-Advanced-Tech-FH-Guangdong-Fenghua-Advanced-Tech-0201CG8R0D250NT_C285063.html
footprint CAP-0201 (0201 (0603M) Capacitor)
pins: 1, 2

## 0201CG8R2C250NT
designator C?  Capacitance: 8.2pF  (hidden comment: *)
Capacitor, Ceramic (MLCC), 8.2pF, 25V, C0G, SMD 0201; Manufacturer: FH (Guangdong Fenghua Advanced Tech); Manufacturer Part Number: 0201CG8R2C250NT; Package Size: 0201; JLCPCB Basic Part: No; JLCPCB Part Number: C301913; Supplier 1: LCSC; Category: Capacitors - MLCC; Supplier Part Number 1: C301913; Voltage Rating: 25V; Temperature Coefficient: C0G; RoHS: Yes; ComponentLink1Description: Datasheet; ComponentLink1URL: https://wmsc.lcsc.com/wmsc/upload/file/pdf/v2/lcsc/2304140030_FH--Guangdong-Fenghua-Advanced-Tech-0201CG8R2C250NT_C301913.pdf; ComponentLink2Description: JLCPCB Part URL; ComponentLink2URL: https://jlcpcb.com/partdetail/C301913; ComponentLink3Description: LCSC Part URL; ComponentLink3URL: https://lcsc.com/product-detail/Multilayer-Ceramic-Capacitors-MLCC---SMD-SMT_FH-Guangdong-Fenghua-Advanced-Tech-FH-Guangdong-Fenghua-Advanced-Tech-0201CG8R2C250NT_C301913.html
footprint CAP-0201 (0201 (0603M) Capacitor)
pins: 1, 2

## 0201CG8R2D500NT
designator C?  Capacitance: 8.2pF  (hidden comment: *)
Capacitor, Ceramic (MLCC), 8.2pF, 50V, C0G, SMD 0201; Manufacturer: FH (Guangdong Fenghua Advanced Tech); Manufacturer Part Number: 0201CG8R2D500NT; Package Size: 0201; JLCPCB Basic Part: No; JLCPCB Part Number: C913427; Supplier 1: LCSC; Category: Capacitors - MLCC; Supplier Part Number 1: C913427; Voltage Rating: 50V; Temperature Coefficient: C0G; RoHS: Yes; ComponentLink1Description: Datasheet; ComponentLink1URL: https://wmsc.lcsc.com/wmsc/upload/file/pdf/v2/lcsc/2304140030_FH--Guangdong-Fenghua-Advanced-Tech-0201CG8R2D500NT_C913427.pdf; ComponentLink2Description: JLCPCB Part URL; ComponentLink2URL: https://jlcpcb.com/partdetail/C913427; ComponentLink3Description: LCSC Part URL; ComponentLink3URL: https://lcsc.com/product-detail/Multilayer-Ceramic-Capacitors-MLCC---SMD-SMT_FH-Guangdong-Fenghua-Advanced-Tech-FH-Guangdong-Fenghua-Advanced-Tech-0201CG8R2D500NT_C913427.html
footprint CAP-0201 (0201 (0603M) Capacitor)
pins: 1, 2

## 0201CG9R0D500NT
designator C?  Capacitance: 9pF  (hidden comment: *)
Capacitor, Ceramic (MLCC), 9pF, 50V, C0G, SMD 0201; Manufacturer: FH (Guangdong Fenghua Advanced Tech); Manufacturer Part Number: 0201CG9R0D500NT; Package Size: 0201; JLCPCB Basic Part: No; JLCPCB Part Number: C285049; Supplier 1: LCSC; Category: Capacitors - MLCC; Supplier Part Number 1: C285049; Voltage Rating: 50V; Temperature Coefficient: C0G; RoHS: Yes; ComponentLink1Description: Datasheet; ComponentLink1URL: https://wmsc.lcsc.com/wmsc/upload/file/pdf/v2/lcsc/2304140030_FH--Guangdong-Fenghua-Advanced-Tech-0201CG9R0D500NT_C285049.pdf; ComponentLink2Description: JLCPCB Part URL; ComponentLink2URL: https://jlcpcb.com/partdetail/C285049; ComponentLink3Description: LCSC Part URL; ComponentLink3URL: https://lcsc.com/product-detail/Multilayer-Ceramic-Capacitors-MLCC---SMD-SMT_FH-Guangdong-Fenghua-Advanced-Tech-FH-Guangdong-Fenghua-Advanced-Tech-0201CG9R0D500NT_C285049.html
footprint CAP-0201 (0201 (0603M) Capacitor)
pins: 1, 2

## 0201CG9R1C500NT
designator C?  Capacitance: 9.1pF  (hidden comment: *)
Capacitor, Ceramic (MLCC), 9.1pF, 50V, C0G, SMD 0201; Manufacturer: FH (Guangdong Fenghua Advanced Tech); Manufacturer Part Number: 0201CG9R1C500NT; Package Size: 0201; JLCPCB Basic Part: No; JLCPCB Part Number: C507060; Supplier 1: LCSC; Category: Capacitors - MLCC; Supplier Part Number 1: C507060; Voltage Rating: 50V; Temperature Coefficient: C0G; RoHS: Yes; ComponentLink1Description: Datasheet; ComponentLink1URL: https://wmsc.lcsc.com/wmsc/upload/file/pdf/v2/lcsc/2304140030_FH--Guangdong-Fenghua-Advanced-Tech-0201CG9R1C500NT_C507060.pdf; ComponentLink2Description: JLCPCB Part URL; ComponentLink2URL: https://jlcpcb.com/partdetail/C507060; ComponentLink3Description: LCSC Part URL; ComponentLink3URL: https://lcsc.com/product-detail/Multilayer-Ceramic-Capacitors-MLCC---SMD-SMT_FH-Guangdong-Fenghua-Advanced-Tech-FH-Guangdong-Fenghua-Advanced-Tech-0201CG9R1C500NT_C507060.html
footprint CAP-0201 (0201 (0603M) Capacitor)
pins: 1, 2

## 0201CG100J500NT
designator C?  Capacitance: 10pF  (hidden comment: *)
Capacitor, Ceramic (MLCC), 10pF, ±5%, 50V, C0G, ±5%, SMD 0201; Manufacturer: FH (Guangdong Fenghua Advanced Tech); Manufacturer Part Number: 0201CG100J500NT; Package Size: 0201; JLCPCB Basic Part: No; JLCPCB Part Number: C43535; Supplier 1: LCSC; Category: Capacitors - MLCC; Supplier Part Number 1: C43535; Tolerance: ±5%; Voltage Rating: 50V; Temperature Coefficient: C0G; RoHS: Yes; ComponentLink1Description: Datasheet; ComponentLink1URL: https://wmsc.lcsc.com/wmsc/upload/file/pdf/v2/lcsc/2304140030_FH--Guangdong-Fenghua-Advanced-Tech-0201CG100J500NT_C43535.pdf; ComponentLink2Description: JLCPCB Part URL; ComponentLink2URL: https://jlcpcb.com/partdetail/C43535; ComponentLink3Description: LCSC Part URL; ComponentLink3URL: https://lcsc.com/product-detail/Multilayer-Ceramic-Capacitors-MLCC---SMD-SMT_FH-Guangdong-Fenghua-Advanced-Tech-FH-Guangdong-Fenghua-Advanced-Tech-0201CG100J500NT_C43535.html
footprint CAP-0201 (0201 (0603M) Capacitor)
pins: 1, 2

## 0201CG101J500NT
designator C?  Capacitance: 100pF  (hidden comment: *)
Capacitor, Ceramic (MLCC), 100pF, ±5%, 50V, C0G, ±5%, SMD 0201; Manufacturer: FH(Guangdong Fenghua Advanced Tech); Manufacturer Part Number: 0201CG101J500NT; Package Size: 0201; JLCPCB Basic Part: No; JLCPCB Part Number: C62550; Supplier 1: LCSC; Category: Capacitors - MLCC; Supplier Part Number 1: C62550; Tolerance: ±5%; Voltage Rating: 50V; Temperature Coefficient: C0G; RoHS: Yes; ComponentLink1Description: Datasheet; ComponentLink1URL: https://wmsc.lcsc.com/wmsc/upload/file/pdf/v2/lcsc/2304140030_FH--Guangdong-Fenghua-Advanced-Tech-0201CG101J500NT_C62550.pdf; ComponentLink2Description: JLCPCB Part URL; ComponentLink2URL: https://jlcpcb.com/partdetail/C62550; ComponentLink3Description: LCSC Part URL; ComponentLink3URL: https://lcsc.com/product-detail/Multilayer-Ceramic-Capacitors-MLCC---SMD-SMT_FH-Guangdong-Fenghua-Advanced-Tech-FH-Guangdong-Fenghua-Advanced-Tech-0201CG101J500NT_C62550.html
footprint CAP-0201 (0201 (0603M) Capacitor)
pins: 1, 2

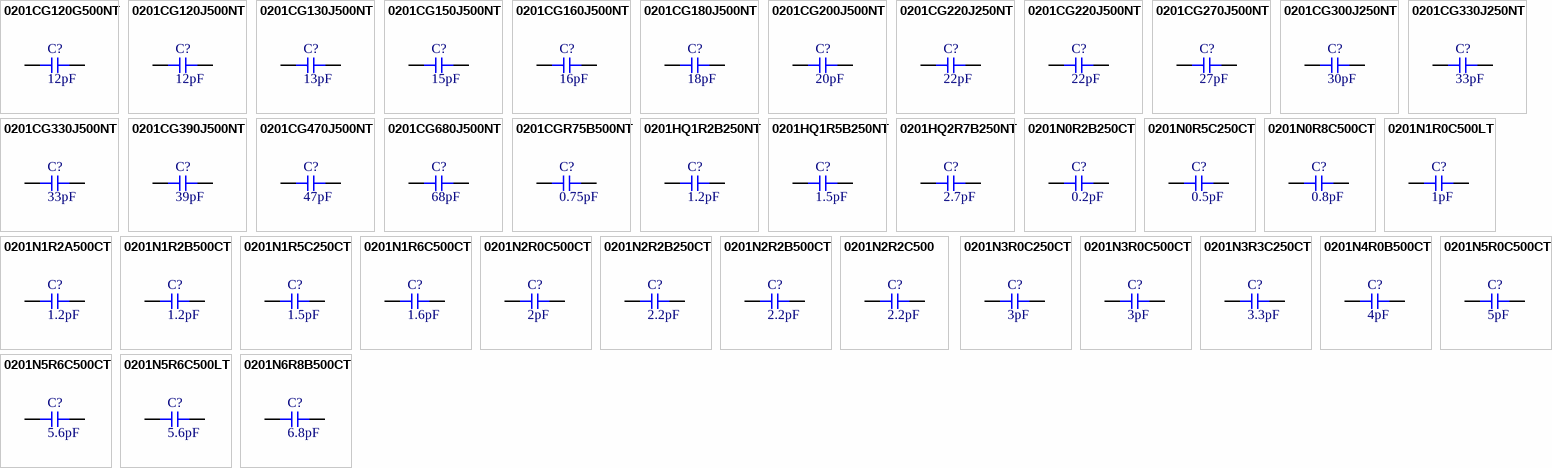
[diagram p2: symbols 0201CG120G500NT to 0201N6R8B500CT]

## 0201CG120G500NT
designator C?  Capacitance: 12pF  (hidden comment: *)
Capacitor, Ceramic (MLCC), 12pF, ±2%, 50V, C0G, ±2%, SMD 0201; Manufacturer: FH (Guangdong Fenghua Advanced Tech); Manufacturer Part Number: 0201CG120G500NT; Package Size: 0201; JLCPCB Basic Part: No; JLCPCB Part Number: C913424; Supplier 1: LCSC; Category: Capacitors - MLCC; Supplier Part Number 1: C913424; Tolerance: ±2%; Voltage Rating: 50V; Temperature Coefficient: C0G; RoHS: Yes; ComponentLink1Description: Datasheet; ComponentLink1URL: https://wmsc.lcsc.com/wmsc/upload/file/pdf/v2/lcsc/2304140030_FH--Guangdong-Fenghua-Advanced-Tech-0201CG120G500NT_C913424.pdf; ComponentLink2Description: JLCPCB Part URL; ComponentLink2URL: https://jlcpcb.com/partdetail/C913424; ComponentLink3Description: LCSC Part URL; ComponentLink3URL: https://lcsc.com/product-detail/Multilayer-Ceramic-Capacitors-MLCC---SMD-SMT_FH-Guangdong-Fenghua-Advanced-Tech-FH-Guangdong-Fenghua-Advanced-Tech-0201CG120G500NT_C913424.html
footprint CAP-0201 (0201 (0603M) Capacitor)
pins: 1, 2

## 0201CG120J500NT
designator C?  Capacitance: 12pF  (hidden comment: *)
Capacitor, Ceramic (MLCC), 12pF, ±5%, 50V, C0G, ±5%, SMD 0201; Manufacturer: FH (Guangdong Fenghua Advanced Tech); Manufacturer Part Number: 0201CG120J500NT; Package Size: 0201; JLCPCB Basic Part: No; JLCPCB Part Number: C50391; Supplier 1: LCSC; Category: Capacitors - MLCC; Supplier Part Number 1: C50391; Tolerance: ±5%; Voltage Rating: 50V; Temperature Coefficient: C0G; RoHS: Yes; ComponentLink1Description: Datasheet; ComponentLink1URL: https://wmsc.lcsc.com/wmsc/upload/file/pdf/v2/lcsc/2304140030_FH--Guangdong-Fenghua-Advanced-Tech-0201CG120J500NT_C50391.pdf; ComponentLink2Description: JLCPCB Part URL; ComponentLink2URL: https://jlcpcb.com/partdetail/C50391; ComponentLink3Description: LCSC Part URL; ComponentLink3URL: https://lcsc.com/product-detail/Multilayer-Ceramic-Capacitors-MLCC---SMD-SMT_FH-Guangdong-Fenghua-Advanced-Tech-FH-Guangdong-Fenghua-Advanced-Tech-0201CG120J500NT_C50391.html
footprint CAP-0201 (0201 (0603M) Capacitor)
pins: 1, 2

## 0201CG130J500NT
designator C?  Capacitance: 13pF  (hidden comment: *)
Capacitor, Ceramic (MLCC), 13pF, ±5%, 50V, C0G, ±5%, SMD 0201; Manufacturer: FH (Guangdong Fenghua Advanced Tech); Manufacturer Part Number: 0201CG130J500NT; Package Size: 0201; JLCPCB Basic Part: No; JLCPCB Part Number: C967564; Supplier 1: LCSC; Category: Capacitors - MLCC; Supplier Part Number 1: C967564; Tolerance: ±5%; Voltage Rating: 50V; Temperature Coefficient: C0G; RoHS: Yes; ComponentLink1Description: Datasheet; ComponentLink1URL: https://wmsc.lcsc.com/wmsc/upload/file/pdf/v2/lcsc/2304140030_FH--Guangdong-Fenghua-Advanced-Tech-0201CG130J500NT_C967564.pdf; ComponentLink2Description: JLCPCB Part URL; ComponentLink2URL: https://jlcpcb.com/partdetail/C967564; ComponentLink3Description: LCSC Part URL; ComponentLink3URL: https://lcsc.com/product-detail/Multilayer-Ceramic-Capacitors-MLCC---SMD-SMT_FH-Guangdong-Fenghua-Advanced-Tech-FH-Guangdong-Fenghua-Advanced-Tech-0201CG130J500NT_C967564.html
footprint CAP-0201 (0201 (0603M) Capacitor)
pins: 1, 2

## 0201CG150J500NT
designator C?  Capacitance: 15pF  (hidden comment: *)
Capacitor, Ceramic (MLCC), 15pF, ±5%, 50V, C0G, ±5%, SMD 0201; Manufacturer: FH(Guangdong Fenghua Advanced Tech); Manufacturer Part Number: 0201CG150J500NT; Package Size: 0201; JLCPCB Basic Part: No; JLCPCB Part Number: C64554; Supplier 1: LCSC; Category: Capacitors - MLCC; Supplier Part Number 1: C64554; Tolerance: ±5%; Voltage Rating: 50V; Temperature Coefficient: C0G; RoHS: Yes; ComponentLink1Description: Datasheet; ComponentLink1URL: https://wmsc.lcsc.com/wmsc/upload/file/pdf/v2/lcsc/2304140030_FH--Guangdong-Fenghua-Advanced-Tech-0201CG150J500NT_C64554.pdf; ComponentLink2Description: JLCPCB Part URL; ComponentLink2URL: https://jlcpcb.com/partdetail/C64554; ComponentLink3Description: LCSC Part URL; ComponentLink3URL: https://lcsc.com/product-detail/Multilayer-Ceramic-Capacitors-MLCC---SMD-SMT_FH-Guangdong-Fenghua-Advanced-Tech-FH-Guangdong-Fenghua-Advanced-Tech-0201CG150J500NT_C64554.html
footprint CAP-0201 (0201 (0603M) Capacitor)
pins: 1, 2

## 0201CG160J500NT
designator C?  Capacitance: 16pF  (hidden comment: *)
Capacitor, Ceramic (MLCC), 16pF, 50V, SMD 0201; Manufacturer: FH(Guangdong Fenghua Advanced Tech); Manufacturer Part Number: 0201CG160J500NT; Package Size: 0201; JLCPCB Basic Part: No; JLCPCB Part Number: C2894310; Supplier 1: LCSC; Category: Capacitors - MLCC; Supplier Part Number 1: C2894310; Voltage Rating: 50V; RoHS: Yes; ComponentLink1Description: Datasheet; ComponentLink1URL: https://wmsc.lcsc.com/wmsc/upload/file/pdf/v2/lcsc/2109100930_FH--Guangdong-Fenghua-Advanced-Tech-0201CG160J500NT_C2894310.pdf; ComponentLink2Description: JLCPCB Part URL; ComponentLink2URL: https://jlcpcb.com/partdetail/C2894310; ComponentLink3Description: LCSC Part URL; ComponentLink3URL: https://lcsc.com/product-detail/Multilayer-Ceramic-Capacitors-MLCC---SMD-SMT_FH-Guangdong-Fenghua-Advanced-Tech-FH-Guangdong-Fenghua-Advanced-Tech-0201CG160J500NT_C2894310.html
footprint CAP-0201 (0201 (0603M) Capacitor)
pins: 1, 2
